# Altium footprint library WR-TBL_Rising Cage Clamp.PcbLib: 435 footprints (part 23 of 28)
Each footprint in its own frame and in the unit in brackets; x right, y up, seen from the top. Pads: shape width x height; smd on the part's side, far side on the other; paste and mask are expansions set on the pad; w line width, h text height; cw(c..) or ccw(c..) is an arc to the next point about the centre after c.
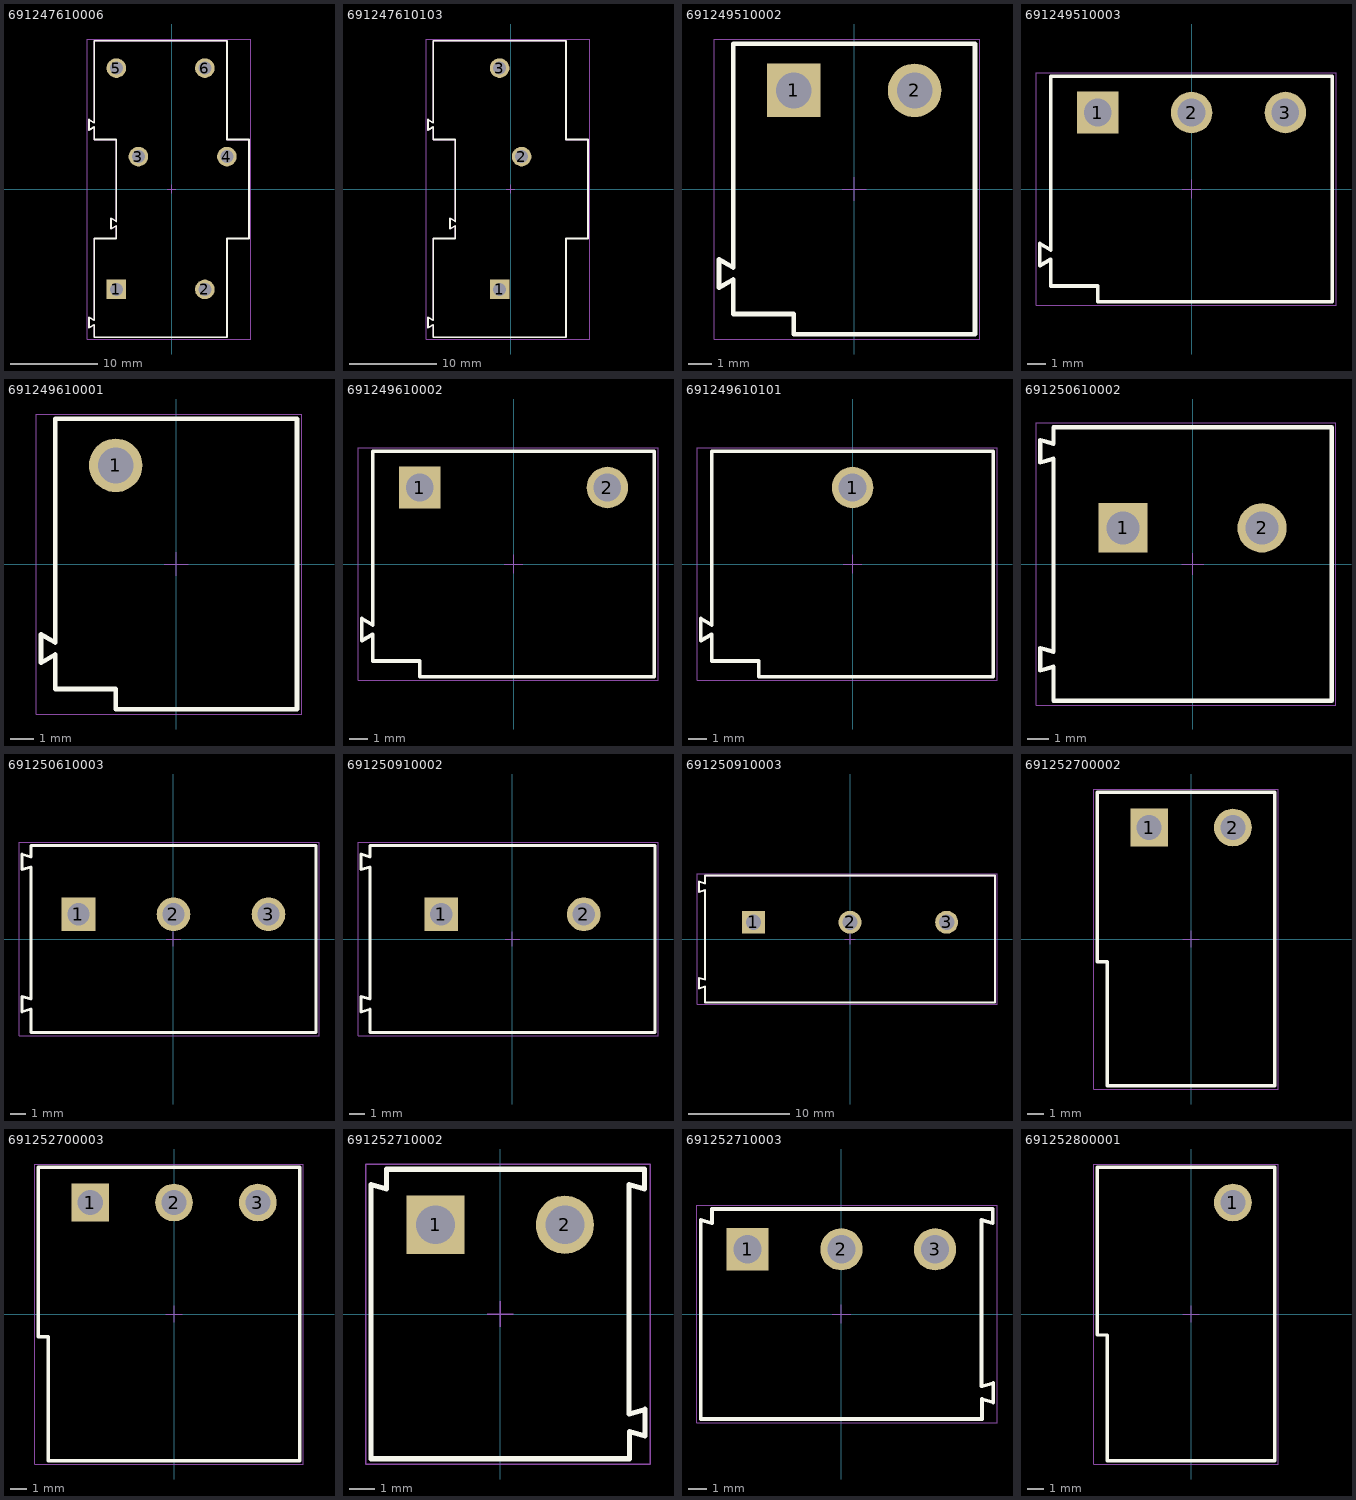
[diagram p22: the footprints below, top view; thin cyan lines are the x and y axes]

## 691247610006 [mm] "10.16mm Horizontal Cable Entry with Rising Cage Clamp, 06p"
height 45
pads (6):
  rect 2.25x2.25 hole 1.5: 1(-6.35,-11.525)
  round 2.25 hole 1.5: 2(3.81,-11.525) 3(-3.81,3.715) 4(6.35,3.715) 5(-6.35,13.875) 6(3.81,13.875)
Top Overlay:
  lines w0.2: -8.89,17.025 -8.89,7.63 -9.49,7.975 -9.49,6.775 -8.89,7.12 -8.89,5.675 -6.35,5.675 -6.35,-3.72 -6.95,-3.375 -6.95,-4.575 -6.35,-4.23 -6.35,-5.675 -8.89,-5.675 -8.89,-15.07 -9.49,-14.725 -9.49,-15.925 -8.89,-15.58 -8.89,-17.025 6.35,-17.025 6.35,-5.675 8.89,-5.675 8.89,5.675 6.35,5.675 6.35,17.025 -8.89,17.025
Mechanical 13:
  lines w0.1: -8.89,17.025 -8.89,7.63 -9.49,7.975 -9.49,6.775 -8.89,7.12 -8.89,5.675 -6.35,5.675 -6.35,-3.72 -6.95,-3.375 -6.95,-4.575 -6.35,-4.23 -6.35,-5.675 -8.89,-5.675 -8.89,-15.07 -9.49,-14.725 -9.49,-15.925 -8.89,-15.58 -8.89,-17.025 6.35,-17.025 6.35,-5.675 8.89,-5.675 8.89,5.675 6.35,5.675 6.35,17.025 -8.89,17.025
Mechanical 15:
  lines w0.05: -0.5,0 0.5,0 ; 0,-0.5 0,0.5 ; -9.69,-17.225 -9.69,17.225 9.09,17.225 9.09,-17.225 -9.69,-17.225
3D body "691247610006.stp": height 45.1, standoff -3.9, extent -9.49,-17.025 8.89,17.025

## 691247610103 [mm] "10.16mm Horizontal Cable Entry with Rising Cage Clamp, 03p"
height 45
pads (3):
  rect 2.25x2.25 hole 1.5: 1(-1.27,-11.525)
  round 2.25 hole 1.5: 2(1.27,3.715) 3(-1.27,13.875)
Top Overlay:
  lines w0.2: -8.89,17.025 -8.89,7.63 -9.49,7.975 -9.49,6.775 -8.89,7.12 -8.89,5.675 -6.35,5.675 -6.35,-3.72 -6.95,-3.375 -6.95,-4.575 -6.35,-4.23 -6.35,-5.675 -8.89,-5.675 -8.89,-15.07 -9.49,-14.725 -9.49,-15.925 -8.89,-15.58 -8.89,-17.025 6.35,-17.025 6.35,-5.675 8.89,-5.675 8.89,5.675 6.35,5.675 6.35,17.025 -8.89,17.025
Mechanical 13:
  lines w0.1: -8.89,17.025 -8.89,7.63 -9.49,7.975 -9.49,6.775 -8.89,7.12 -8.89,5.675 -6.35,5.675 -6.35,-3.72 -6.95,-3.375 -6.95,-4.575 -6.35,-4.23 -6.35,-5.675 -8.89,-5.675 -8.89,-15.07 -9.49,-14.725 -9.49,-15.925 -8.89,-15.58 -8.89,-17.025 6.35,-17.025 6.35,-5.675 8.89,-5.675 8.89,5.675 6.35,5.675 6.35,17.025 -8.89,17.025
Mechanical 15:
  lines w0.05: -0.5,0 0.5,0 ; 0,-0.5 0,0.5 ; -9.69,-17.225 -9.69,17.225 9.09,17.225 9.09,-17.225 -9.69,-17.225
3D body "691247610103.stp": height 45.1, standoff -3.9, extent -9.49,-17.025 8.89,17.025

## 691249510002 [mm] "5.08mm Horizontal Cable Entry with Rising Cage Clamp, 02p"
height 31.5
pads (2):
  rect 2.25x2.25 hole 1.5: 1(-2.54,4.14)
  round 2.25 hole 1.5: 2(2.54,4.14)
Top Overlay:
  lines w0.2: -5.081,-3.798 -5.68,-4.15 -5.68,-2.95 -5.081,-3.302 ; -5.08,-3.8 -5.08,-5.25 -2.54,-5.25 -2.54,-6.1 5.08,-6.1 5.08,6.1 -5.08,6.1 -5.08,-3.301
Mechanical 13:
  lines w0.1: -5.081,-3.798 -5.68,-4.15 -5.68,-2.95 -5.081,-3.302 ; -5.08,-3.8 -5.08,-5.25 -2.54,-5.25 -2.54,-6.1 5.08,-6.1 5.08,6.1 -5.08,6.1 -5.08,-3.301
Mechanical 15:
  lines w0.05: -0.5,0 0.5,0 ; 0,-0.5 0,0.5 ; -5.88,-6.3 -5.88,6.3 5.28,6.3 5.28,-6.3 -5.88,-6.3
3D body "691249510002.stp": height 31.6, standoff -3.9, extent -5.68,-6.1 5.08,6.1

## 691249510003 [mm] "5.08mm Horizontal Cable Entry with Rising Cage Clamp, 03p"
height 31.5
pads (3):
  rect 2.25x2.25 hole 1.5: 1(-5.08,4.14)
  round 2.25 hole 1.5: 2(0,4.14) 3(5.08,4.14)
Top Overlay:
  lines w0.2: -7.621,-3.798 -8.22,-4.15 -8.22,-2.95 -7.621,-3.302 ; -7.62,-3.8 -7.62,-5.25 -5.08,-5.25 -5.08,-6.1 7.62,-6.1 7.62,6.1 -7.62,6.1 -7.62,-3.301
Mechanical 13:
  lines w0.1: -7.621,-3.798 -8.22,-4.15 -8.22,-2.95 -7.621,-3.302 ; -7.62,-3.8 -7.62,-5.25 -5.08,-5.25 -5.08,-6.1 7.62,-6.1 7.62,6.1 -7.62,6.1 -7.62,-3.301
Mechanical 15:
  lines w0.05: -0.5,0 0.5,0 ; 0,-0.5 0,0.5 ; -8.42,-6.3 7.82,-6.3 7.82,6.3 -8.42,6.3 -8.42,-6.3
3D body "691249510003.stp": height 31.6, standoff -3.9, extent -8.22,-6.1 7.62,6.1

## 691249610001 [mm] "10.16mm Horizontal Cable Entry with Rising Cage Clamp, 01p"
height 31.5
pads (1):
  round 2.25 hole 1.5: 1(-2.54,4.14)
Top Overlay:
  lines w0.2: -5.68,-4.152 -5.08,-3.8 -5.08,-5.25 -2.54,-5.25 -2.54,-6.1 5.08,-6.1 5.08,6.1 -5.08,6.1 -5.08,-3.302 -5.68,-2.95 -5.68,-4.152
Mechanical 13:
  lines w0.1: -5.68,-4.152 -5.68,-2.95 -5.08,-3.302 -5.08,6.1 5.08,6.1 5.08,-6.1 -2.54,-6.1 -2.54,-5.25 -5.08,-5.25 -5.08,-3.8 -5.68,-4.152
Mechanical 15:
  lines w0.05: -0.5,0 0.5,0 ; 0,-0.5 0,0.5 ; -5.88,-6.3 5.28,-6.3 5.28,6.3 -5.88,6.3 -5.88,-6.3
3D body "691249610001.stp": height 31.6, standoff -3.9, extent -5.68,-6.1 5.08,6.1

## 691249610002 [mm] "10.16mm Horizontal Cable Entry with Rising Cage Clamp, 02p"
height 31.5
pads (2):
  rect 2.25x2.25 hole 1.5: 1(-5.08,4.14)
  round 2.25 hole 1.5: 2(5.08,4.14)
Top Overlay:
  lines w0.2: -8.22,-4.152 -8.22,-2.95 -7.62,-3.302 -7.62,6.1 7.62,6.1 7.62,-6.1 -5.08,-6.1 -5.08,-5.25 -7.62,-5.25 -7.62,-3.8 -8.22,-4.152
Mechanical 13:
  lines w0.1: -8.22,-4.152 -7.62,-3.8 -7.62,-5.25 -5.08,-5.25 -5.08,-6.1 7.62,-6.1 7.62,6.1 -7.62,6.1 -7.62,-3.302 -8.22,-2.95 -8.22,-4.152
Mechanical 15:
  lines w0.05: -0.5,0 0.5,0 ; 0,-0.5 0,0.5 ; -8.42,-6.3 -8.42,6.3 7.82,6.3 7.82,-6.3 -8.42,-6.3
3D body "691249610002.stp": height 31.6, standoff -3.9, extent -8.22,-6.1 7.62,6.1

## 691249610101 [mm] "10.16mm Horizontal Cable Entry with Rising Cage Clamp, 01p"
height 31.5
pads (1):
  round 2.25 hole 1.5: 1(0,4.14)
Top Overlay:
  lines w0.2: -8.22,-4.152 -8.22,-2.95 -7.62,-3.302 -7.62,6.1 7.62,6.1 7.62,-6.1 -5.08,-6.1 -5.08,-5.25 -7.62,-5.25 -7.62,-3.8 -8.22,-4.152
Mechanical 13:
  lines w0.1: -8.22,-4.152 -7.62,-3.8 -7.62,-5.25 -5.08,-5.25 -5.08,-6.1 7.62,-6.1 7.62,6.1 -7.62,6.1 -7.62,-3.302 -8.22,-2.95 -8.22,-4.152
Mechanical 15:
  lines w0.05: -0.5,0 0.5,0 ; 0,-0.5 0,0.5 ; -8.42,-6.3 -8.42,6.3 7.82,6.3 7.82,-6.3 -8.42,-6.3
3D body "691249610101.stp": height 31.6, standoff -3.9, extent -8.22,-6.1 7.62,6.1

## 691250610002 [mm] "Serie 2506 - 6.35 mm _ 2 pins"
height 21.5
pads (2):
  rect 2.25x2.25 hole 1.5: 1(-3.175,1.65)
  round 2.25 hole 1.5: 2(3.175,1.65)
Top Overlay:
  lines w0.2: -6.95,-4.865 -6.95,-3.835 -6.35,-4.01 -6.35,4.81 -6.95,4.635 -6.95,5.665 -6.35,5.49 -6.35,6.25 6.35,6.25 6.35,-6.25 -6.35,-6.25 -6.35,-4.69 -6.95,-4.865
Mechanical 13:
  lines w0.1: -6.95,-4.865 -6.35,-4.69 -6.35,-6.25 6.35,-6.25 6.35,6.25 -6.35,6.25 -6.35,5.49 -6.95,5.665 -6.95,4.635 -6.35,4.81 -6.35,-4.01 -6.95,-3.835 -6.95,-4.865
Mechanical 15:
  lines w0.05: -0.5,0 0.5,0 ; 0,-0.5 0,0.5 ; -7.15,-6.45 -7.15,6.45 6.55,6.45 6.55,-6.45 -7.15,-6.45
3D body "691250610002.stp": height 21.6, standoff -4.9, extent -6.95,-6.25 6.35,6.25

## 691250610003 [mm] "Serie 2506 - 6.35 mm _ 3 pins"
height 21.5
pads (3):
  rect 2.25x2.25 hole 1.5: 1(-6.35,1.65)
  round 2.25 hole 1.5: 2(0,1.65) 3(6.35,1.65)
Top Overlay:
  lines w0.2: -10.125,-4.865 -9.525,-4.69 -9.525,-6.25 9.525,-6.25 9.525,6.25 -9.525,6.25 -9.525,5.49 -10.125,5.665 -10.125,4.635 -9.525,4.81 -9.525,-4.01 -10.125,-3.835 -10.125,-4.865
Mechanical 13:
  lines w0.1: -10.125,-4.865 -10.125,-3.835 -9.525,-4.01 -9.525,4.81 -10.125,4.635 -10.125,5.665 -9.525,5.49 -9.525,6.25 9.525,6.25 9.525,-6.25 -9.525,-6.25 -9.525,-4.69 -10.125,-4.865
Mechanical 15:
  lines w0.05: -0.5,0 0.5,0 ; 0,-0.5 0,0.5 ; -10.325,-6.45 9.725,-6.45 9.725,6.45 -10.325,6.45 -10.325,-6.45
3D body "691250610003.stp": height 21.6, standoff -4.9, extent -10.125,-6.25 9.525,6.25

## 691250910002 [mm] "Serie 2509 - 9.52 mm _ 2 pins"
height 21.5
pads (2):
  rect 2.25x2.25 hole 1.5: 1(-4.76,1.65)
  round 2.25 hole 1.5: 2(4.76,1.65)
Top Overlay:
  lines w0.2: -10.12,-4.865 -9.52,-4.69 -9.52,-6.25 9.52,-6.25 9.52,6.25 -9.52,6.25 -9.52,5.49 -10.12,5.665 -10.12,4.635 -9.52,4.81 -9.52,-4.01 -10.12,-3.835 -10.12,-4.865
Mechanical 13:
  lines w0.1: -10.12,-4.865 -10.12,-3.835 -9.52,-4.01 -9.52,4.81 -10.12,4.635 -10.12,5.665 -9.52,5.49 -9.52,6.25 9.52,6.25 9.52,-6.25 -9.52,-6.25 -9.52,-4.69 -10.12,-4.865
Mechanical 15:
  lines w0.05: -0.5,0 0.5,0 ; 0,-0.5 0,0.5 ; -10.32,-6.45 9.72,-6.45 9.72,6.45 -10.32,6.45 -10.32,-6.45
3D body "691250910002.stp": height 21.6, standoff -4.9, extent -10.12,-6.25 9.52,6.25

## 691250910003 [mm] "Serie 2509 - 9.52 mm _ 3 pins"
height 21.5
pads (3):
  rect 2.25x2.25 hole 1.5: 1(-9.52,1.65)
  round 2.25 hole 1.5: 2(0,1.65) 3(9.52,1.65)
Top Overlay:
  lines w0.2: -14.88,-4.865 -14.88,-3.835 -14.28,-4.01 -14.28,4.81 -14.88,4.635 -14.88,5.665 -14.28,5.49 -14.28,6.25 14.28,6.25 14.28,-6.25 -14.28,-6.25 -14.28,-4.69 -14.88,-4.865
Mechanical 13:
  lines w0.1: -14.88,-4.865 -14.28,-4.69 -14.28,-6.25 14.28,-6.25 14.28,6.25 -14.28,6.25 -14.28,5.49 -14.88,5.665 -14.88,4.635 -14.28,4.81 -14.28,-4.01 -14.88,-3.835 -14.88,-4.865
Mechanical 15:
  lines w0.05: -0.5,0 0.5,0 ; 0,-0.5 0,0.5 ; -15.08,-6.45 -15.08,6.45 14.48,6.45 14.48,-6.45 -15.08,-6.45
3D body "691250910003.stp": height 21.6, standoff -4.9, extent -14.88,-6.25 14.28,6.25

## 691252700002 [mm] "Serie 2527 - 5.00 mm _ 2 pins"
height 16
pads (2):
  rect 2.25x2.25 hole 1.5: 1(-2.5,6.65)
  round 2.25 hole 1.5: 2(2.5,6.65)
Top Overlay:
  lines w0.2: -5.6,-1.35 -5,-1.35 -5,-8.75 5,-8.75 5,8.75 -5.6,8.75 -5.6,-1.35
Mechanical 13:
  lines w0.1: -5.6,-1.35 -5.6,8.75 5,8.75 5,-8.75 -5,-8.75 -5,-1.35 -5.6,-1.35
Mechanical 15:
  lines w0.05: -0.5,0 0.5,0 ; 0,-0.5 0,0.5 ; -5.8,-8.95 5.2,-8.95 5.2,8.95 -5.8,8.95 -5.8,-8.95
3D body "691252700002.stp": height 16.05, standoff -2.95, extent -5.6,-8.75 5,8.75

## 691252700003 [mm] "Serie 2527 - 5.00 mm _ 3 pins"
height 16
pads (3):
  rect 2.25x2.25 hole 1.5: 1(-5,6.65)
  round 2.25 hole 1.5: 2(0,6.65) 3(5,6.65)
Top Overlay:
  lines w0.2: -8.1,-1.35 -8.1,8.75 7.5,8.75 7.5,-8.75 -7.5,-8.75 -7.5,-1.35 -8.1,-1.35
Mechanical 13:
  lines w0.1: -8.1,-1.35 -7.5,-1.35 -7.5,-8.75 7.5,-8.75 7.5,8.75 -8.1,8.75 -8.1,-1.35
Mechanical 15:
  lines w0.05: -0.5,0 0.5,0 ; 0,-0.5 0,0.5 ; -8.3,-8.95 -8.3,8.95 7.7,8.95 7.7,-8.95 -8.3,-8.95
3D body "691252700003.stp": height 16.05, standoff -2.95, extent -8.1,-8.75 7.5,8.75

## 691252710002 [mm] "Serie 2527 - 5.00 mm _ 2 pins"
height 17.5
pads (2):
  rect 2.25x2.25 hole 1.5: 1(-2.5,3.45)
  round 2.25 hole 1.5: 2(2.5,3.45)
Top Overlay:
  lines w0.2: 4.98,-3.86 4.98,5.01 5.58,4.84 5.58,5.6 -4.4,5.6 -4.4,4.84 -5,5.01 -5,-5.6 5,-5.6 5,-4.54 5.6,-4.715 5.6,-3.685 5,-3.86
Mechanical 13:
  lines w0.1: 4.98,-3.86 4.98,5.01 5.58,4.84 5.58,5.6 -4.4,5.6 -4.4,4.84 -5,5.01 -5,-5.6 5,-5.6 5,-4.54 5.6,-4.715 5.6,-3.685 5,-3.86
Mechanical 15:
  lines w0.05: -0.5,0 0.5,0 ; 0,-0.5 0,0.5 ; -5.2,-5.8 -5.2,5.8 5.8,5.8 5.8,-5.8 -5.2,-5.8
3D body "691252710002.stp": height 17.6, standoff -2.9, extent -5.02,-5.6 5.58,5.6

## 691252710003 [mm] "Serie 2527 - 5.00 mm _ 3 pins"
height 17.5
pads (3):
  rect 2.25x2.25 hole 1.5: 1(-5,3.45)
  round 2.25 hole 1.5: 2(0,3.45) 3(5,3.45)
Top Overlay:
  lines w0.2: 7.48,-3.86 7.48,5.01 8.08,4.84 8.08,5.6 -6.9,5.6 -6.9,4.84 -7.5,5.01 -7.5,-5.6 7.5,-5.6 7.5,-4.54 8.1,-4.715 8.1,-3.685 7.5,-3.86
Mechanical 13:
  lines w0.1: 7.48,-3.86 7.48,5.01 8.08,4.84 8.08,5.6 -6.9,5.6 -6.9,4.84 -7.5,5.01 -7.5,-5.6 7.5,-5.6 7.5,-4.54 8.1,-4.715 8.1,-3.685 7.5,-3.86
Mechanical 15:
  lines w0.05: -0.5,0 0.5,0 ; 0,-0.5 0,0.5 ; -7.7,-5.8 -7.7,5.8 8.3,5.8 8.3,-5.8 -7.7,-5.8
3D body "691252710003.stp": height 17.6, standoff -2.9, extent -7.52,-5.6 8.08,5.6

## 691252800001 [mm] "Serie 2528-10mm Vertical Cable Entry, 01p"
height 16
pads (1):
  round 2.25 hole 1.5: 1(2.5,6.65)
Top Overlay:
  lines w0.2: -5.6,-1.25 -5.6,8.75 5,8.75 5,-8.75 -5,-8.75 -5,-1.25 -5.6,-1.25
Mechanical 13:
  lines w0.1: -5.6,-1.25 -5,-1.25 -5,-8.75 5,-8.75 5,8.75 -5.6,8.75 -5.6,-1.25
Mechanical 15:
  lines w0.05: -0.5,0 0.5,0 ; 0,-0.5 0,0.5 ; -5.8,-8.95 5.2,-8.95 5.2,8.95 -5.8,8.95 -5.8,-8.95
3D body "691252800001.stp": height 16.1, standoff -2.9, extent -5.6,-8.75 5,8.75